# Altium footprint library thu vien thong.PcbLib: 106 footprints (part 7 of 7)
Each footprint in its own frame and in the unit in brackets; x right, y up, seen from the top. Pads: shape width x height; smd on the part's side, far side on the other; paste and mask are expansions set on the pad; w line width, h text height; cw(c..) or ccw(c..) is an arc to the next point about the centre after c.
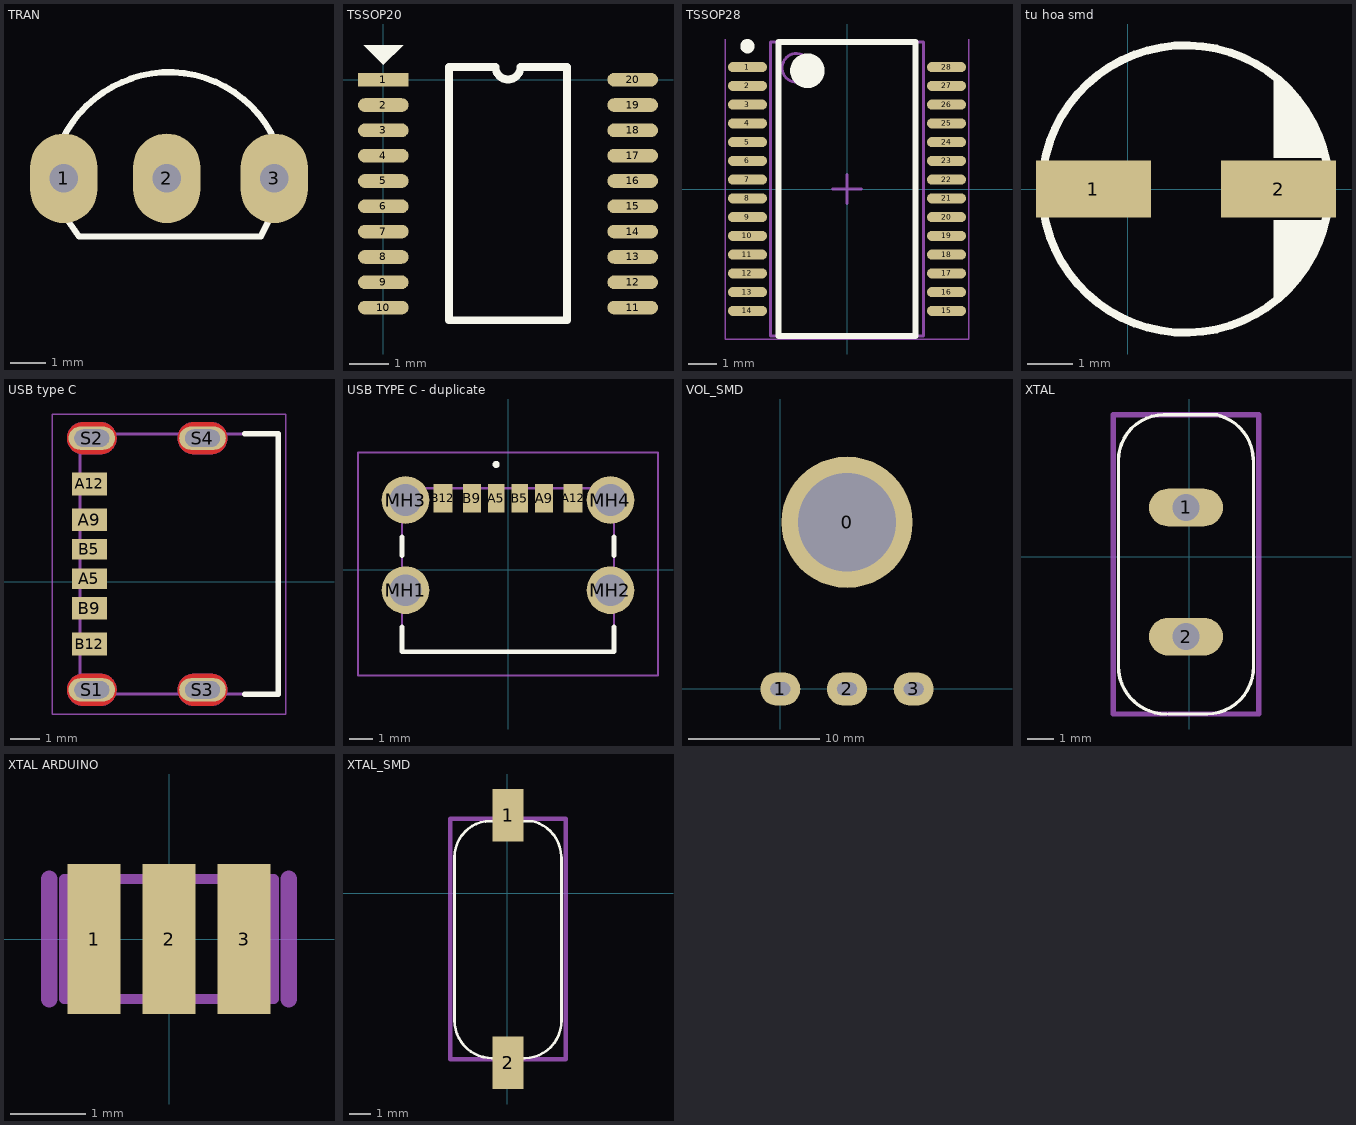
[diagram p6: the footprints below, top view; thin cyan lines are the x and y axes]

## TRAN [mil]
pads (3):
  oval 75x100 hole 32: 1(-1343.62,-418.84) 2(-1228.62,-418.84) 3(-1108.62,-418.84)
Top Overlay:
  lines w7: -1345.15,-375.63 cw(c-1227.65,-431.27) -1267.44,-307.51 ; -1343.96,-459.08 -1326.62,-483.84 -1123.62,-483.84 -1110.62,-457.84 ; -1269.04,-307.63 cw(c-1226.2,-430.37) -1107.14,-378.19
3D body "SW3dPS-TO92.STEP": height 245.04, standoff -199.79, extent -1341.36,-484.41 -1123.62,-323.85

## TSSOP20 [mm]
height 7.62
pads (20):
  rect 1.3x0.35 smd: 1(0,0)
  oval 1.3x0.35 smd: 2(0,-0.65) 3(0,-1.3) 4(0,-1.95) 5(0,-2.6) 6(0,-3.25) 7(0,-3.9) 8(0,-4.55) 9(0,-5.2) 10(0,-5.85) 11(6.4,-5.85) 12(6.4,-5.2) 13(6.4,-4.55) 14(6.4,-3.9) 15(6.4,-3.25) 16(6.4,-2.6) 17(6.4,-1.95) 18(6.4,-1.3) 19(6.4,-0.65) 20(6.4,0)
Top Overlay:
  region: -0.508,0.889 0.508,0.889 0,0.381
  lines w0.2: 2.875,0.325 1.685,0.325 1.685,-6.175 4.715,-6.175 4.715,0.325 3.525,0.325 ; 2.883,0.325 ccw(c3.2,0.325) 3.518,0.325
3D body "User Library-TSSOP-20-1.STEP": height 1, standoff 0, extent 0.02,-6.175 6.43,0.325

## TSSOP28 [mm] "TSSOP, 28-Leads, Body 10.20x5.30mm, Pitch 0.65mm, IPC High Density"
height 1.2
pads (28):
  oval 1.35x0.35 smd: 1(-3.45,4.225) 2(-3.45,3.575) 3(-3.45,2.925) 4(-3.45,2.275) 5(-3.45,1.625) 6(-3.45,0.975) 7(-3.45,0.325) 8(-3.45,-0.325) 9(-3.45,-0.975) 10(-3.45,-1.625) 11(-3.45,-2.275) 12(-3.45,-2.925) 13(-3.45,-3.575) 14(-3.45,-4.225) 15(3.45,-4.225) 16(3.45,-3.575) 17(3.45,-2.925) 18(3.45,-2.275) 19(3.45,-1.625) 20(3.45,-0.975) 21(3.45,-0.325) 22(3.45,0.325) 23(3.45,0.975) 24(3.45,1.625) 25(3.45,2.275) 26(3.45,2.925) 27(3.45,3.575) 28(3.45,4.225)
Top Overlay:
  circle w0.6: c-1.375,4.1 r0.3
  circle w0.25: c-3.45,4.95 r0.125
  lines w0.2: -2.375,-5.1 2.375,-5.1 2.375,5.1 -2.375,5.1 -2.375,-5.1
Mechanical 13:
  circle w0.1: c-1.75,4.2 r0.5
  lines w0.1: -2.65,-5.1 2.65,-5.1 2.65,5.1 -2.65,5.1 -2.65,-5.1
Mechanical 15:
  lines w0.05: -4.225,5.2 -4.225,-5.2 4.225,-5.2 4.225,5.2
  lines w0.1: -0.5,0 0.5,0 ; 0,-0.5 0,0.5
3D body "SOP65P770x200-28N.step": height 2.15, standoff 0, extent -3.878,-5.165 3.878,5.165

## tu hoa smd [mil] "Tu hoa SMD 33 >100 uF,50V, 220uF/16V,25V"
height 100
pads (2):
  rect 100x50 smd: 1(-30,0) 2(131,0)
Top Overlay:
  circle w7: c50,0 r125
  region: 127,98 127,27 172,27 173,9 170,-26 169.75,-27 127,-27 127,-98 141,-86 156,-67 170,-38 175,-19 175,18 170,37 162,58 146,82
  lines w7: -65,0 -45,0 ; -55,-10 -55,-5 -55,5 -55,10

## USB type C [mm]
pads (10):
  rect 1.2x0.7 smd: A5(5.85,0.11) B5(5.85,1.11)
  rect 1.2x0.76 smd: A9(5.85,2.13) B9(5.85,-0.91)
  rect 1.2x0.8 smd: A12(5.85,3.36) B12(5.85,-2.14)
  oval 1.6x0.8 hole 0.6 slot 1.2 at 0 deg mask+0: S1(5.93,-3.71) S2(5.93,4.93) S3(9.73,-3.71) S4(9.73,4.93)
Top Layer:
  region: 8.881,-3.681 8.883,-3.653 8.887,-3.624 8.892,-3.596 8.899,-3.568 8.907,-3.54 8.917,-3.513 8.928,-3.486 8.94,-3.46 8.954,-3.435 8.969,-3.41 8.985,-3.387 9.003,-3.364 9.021,-3.342 9.041,-3.321 9.062,-3.301 9.084,-3.283 9.107,-3.265 9.13,-3.249 9.155,-3.234 9.18,-3.22 9.206,-3.208 9.233,-3.197 9.26,-3.187 9.288,-3.179 9.316,-3.172 9.344,-3.167 9.373,-3.163 9.401,-3.161 9.43,-3.16 10.03,-3.16 10.059,-3.161 10.087,-3.163 10.116,-3.167 10.144,-3.172 10.172,-3.179 10.2,-3.187 10.227,-3.197 10.254,-3.208 10.28,-3.22 10.305,-3.234 10.33,-3.249 10.353,-3.265 10.376,-3.283 10.398,-3.301 10.419,-3.321 10.439,-3.342 10.457,-3.364 10.475,-3.387 10.491,-3.41 10.506,-3.435 10.52,-3.46 10.532,-3.486 10.543,-3.513 10.553,-3.54 10.561,-3.568 10.568,-3.596 10.573,-3.624 10.577,-3.653 10.579,-3.681 10.58,-3.71 10.579,-3.739 10.577,-3.767 10.573,-3.796 10.568,-3.824 10.561,-3.852 10.553,-3.88 10.543,-3.907 10.532,-3.934 10.52,-3.96 10.506,-3.985 10.491,-4.01 10.475,-4.033 10.457,-4.056 10.439,-4.078 10.419,-4.099 10.398,-4.119 10.376,-4.137 10.353,-4.155 10.33,-4.171 10.305,-4.186 10.28,-4.2 10.254,-4.212 10.227,-4.223 10.2,-4.233 10.172,-4.241 10.144,-4.248 10.116,-4.253 10.087,-4.257 10.059,-4.259 10.03,-4.26 9.43,-4.26 9.401,-4.259 9.373,-4.257 9.344,-4.253 9.316,-4.248 9.288,-4.241 9.26,-4.233 9.233,-4.223 9.206,-4.212 9.18,-4.2 9.155,-4.186 9.13,-4.171 9.107,-4.155 9.084,-4.137 9.062,-4.119 9.041,-4.099 9.021,-4.078 9.003,-4.056 8.985,-4.033 8.969,-4.01 8.954,-3.985 8.94,-3.96 8.928,-3.934 8.917,-3.907 8.907,-3.88 8.899,-3.852 8.892,-3.824 8.887,-3.796 8.883,-3.767 8.881,-3.739 8.88,-3.71
  region: 8.881,4.959 8.883,4.987 8.887,5.016 8.892,5.044 8.899,5.072 8.907,5.1 8.917,5.127 8.928,5.154 8.94,5.18 8.954,5.205 8.969,5.23 8.985,5.253 9.003,5.276 9.021,5.298 9.041,5.319 9.062,5.339 9.084,5.357 9.107,5.375 9.13,5.391 9.155,5.406 9.18,5.42 9.206,5.432 9.233,5.443 9.26,5.453 9.288,5.461 9.316,5.468 9.344,5.473 9.373,5.477 9.401,5.479 9.43,5.48 10.03,5.48 10.059,5.479 10.087,5.477 10.116,5.473 10.144,5.468 10.172,5.461 10.2,5.453 10.227,5.443 10.254,5.432 10.28,5.42 10.305,5.406 10.33,5.391 10.353,5.375 10.376,5.357 10.398,5.339 10.419,5.319 10.439,5.298 10.457,5.276 10.475,5.253 10.491,5.23 10.506,5.205 10.52,5.18 10.532,5.154 10.543,5.127 10.553,5.1 10.561,5.072 10.568,5.044 10.573,5.016 10.577,4.987 10.579,4.959 10.58,4.93 10.579,4.901 10.577,4.873 10.573,4.844 10.568,4.816 10.561,4.788 10.553,4.76 10.543,4.733 10.532,4.706 10.52,4.68 10.506,4.655 10.491,4.63 10.475,4.607 10.457,4.584 10.439,4.562 10.419,4.541 10.398,4.521 10.376,4.503 10.353,4.485 10.33,4.469 10.305,4.454 10.28,4.44 10.254,4.428 10.227,4.417 10.2,4.407 10.172,4.399 10.144,4.392 10.116,4.387 10.087,4.383 10.059,4.381 10.03,4.38 9.43,4.38 9.401,4.381 9.373,4.383 9.344,4.387 9.316,4.392 9.288,4.399 9.26,4.407 9.233,4.417 9.206,4.428 9.18,4.44 9.155,4.454 9.13,4.469 9.107,4.485 9.084,4.503 9.062,4.521 9.041,4.541 9.021,4.562 9.003,4.584 8.985,4.607 8.969,4.63 8.954,4.655 8.94,4.68 8.928,4.706 8.917,4.733 8.907,4.76 8.899,4.788 8.892,4.816 8.887,4.844 8.883,4.873 8.881,4.901 8.88,4.93
  region: 5.081,-3.681 5.083,-3.653 5.087,-3.624 5.092,-3.596 5.099,-3.568 5.107,-3.54 5.117,-3.513 5.128,-3.486 5.14,-3.46 5.154,-3.435 5.169,-3.41 5.185,-3.387 5.203,-3.364 5.221,-3.342 5.241,-3.321 5.262,-3.301 5.284,-3.283 5.307,-3.265 5.33,-3.249 5.355,-3.234 5.38,-3.22 5.406,-3.208 5.433,-3.197 5.46,-3.187 5.488,-3.179 5.516,-3.172 5.544,-3.167 5.573,-3.163 5.601,-3.161 5.63,-3.16 6.23,-3.16 6.259,-3.161 6.287,-3.163 6.316,-3.167 6.344,-3.172 6.372,-3.179 6.4,-3.187 6.427,-3.197 6.454,-3.208 6.48,-3.22 6.505,-3.234 6.53,-3.249 6.553,-3.265 6.576,-3.283 6.598,-3.301 6.619,-3.321 6.639,-3.342 6.657,-3.364 6.675,-3.387 6.691,-3.41 6.706,-3.435 6.72,-3.46 6.732,-3.486 6.743,-3.513 6.753,-3.54 6.761,-3.568 6.768,-3.596 6.773,-3.624 6.777,-3.653 6.779,-3.681 6.78,-3.71 6.779,-3.739 6.777,-3.767 6.773,-3.796 6.768,-3.824 6.761,-3.852 6.753,-3.88 6.743,-3.907 6.732,-3.934 6.72,-3.96 6.706,-3.985 6.691,-4.01 6.675,-4.033 6.657,-4.056 6.639,-4.078 6.619,-4.099 6.598,-4.119 6.576,-4.137 6.553,-4.155 6.53,-4.171 6.505,-4.186 6.48,-4.2 6.454,-4.212 6.427,-4.223 6.4,-4.233 6.372,-4.241 6.344,-4.248 6.316,-4.253 6.287,-4.257 6.259,-4.259 6.23,-4.26 5.63,-4.26 5.601,-4.259 5.573,-4.257 5.544,-4.253 5.516,-4.248 5.488,-4.241 5.46,-4.233 5.433,-4.223 5.406,-4.212 5.38,-4.2 5.355,-4.186 5.33,-4.171 5.307,-4.155 5.284,-4.137 5.262,-4.119 5.241,-4.099 5.221,-4.078 5.203,-4.056 5.185,-4.033 5.169,-4.01 5.154,-3.985 5.14,-3.96 5.128,-3.934 5.117,-3.907 5.107,-3.88 5.099,-3.852 5.092,-3.824 5.087,-3.796 5.083,-3.767 5.081,-3.739 5.08,-3.71
  region: 5.081,4.959 5.083,4.987 5.087,5.016 5.092,5.044 5.099,5.072 5.107,5.1 5.117,5.127 5.128,5.154 5.14,5.18 5.154,5.205 5.169,5.23 5.185,5.253 5.203,5.276 5.221,5.298 5.241,5.319 5.262,5.339 5.284,5.357 5.307,5.375 5.33,5.391 5.355,5.406 5.38,5.42 5.406,5.432 5.433,5.443 5.46,5.453 5.488,5.461 5.516,5.468 5.544,5.473 5.573,5.477 5.601,5.479 5.63,5.48 6.23,5.48 6.259,5.479 6.287,5.477 6.316,5.473 6.344,5.468 6.372,5.461 6.4,5.453 6.427,5.443 6.454,5.432 6.48,5.42 6.505,5.406 6.53,5.391 6.553,5.375 6.576,5.357 6.598,5.339 6.619,5.319 6.639,5.298 6.657,5.276 6.675,5.253 6.691,5.23 6.706,5.205 6.72,5.18 6.732,5.154 6.743,5.127 6.753,5.1 6.761,5.072 6.768,5.044 6.773,5.016 6.777,4.987 6.779,4.959 6.78,4.93 6.779,4.901 6.777,4.873 6.773,4.844 6.768,4.816 6.761,4.788 6.753,4.76 6.743,4.733 6.732,4.706 6.72,4.68 6.706,4.655 6.691,4.63 6.675,4.607 6.657,4.584 6.639,4.562 6.619,4.541 6.598,4.521 6.576,4.503 6.553,4.485 6.53,4.469 6.505,4.454 6.48,4.44 6.454,4.428 6.427,4.417 6.4,4.407 6.372,4.399 6.344,4.392 6.316,4.387 6.287,4.383 6.259,4.381 6.23,4.38 5.63,4.38 5.601,4.381 5.573,4.383 5.544,4.387 5.516,4.392 5.488,4.399 5.46,4.407 5.433,4.417 5.406,4.428 5.38,4.44 5.355,4.454 5.33,4.469 5.307,4.485 5.284,4.503 5.262,4.521 5.241,4.541 5.221,4.562 5.203,4.584 5.185,4.607 5.169,4.63 5.154,4.655 5.14,4.68 5.128,4.706 5.117,4.733 5.107,4.76 5.099,4.788 5.092,4.816 5.087,4.844 5.083,4.873 5.081,4.901 5.08,4.93
Bottom Layer:
  region: 8.881,-3.681 8.883,-3.653 8.887,-3.624 8.892,-3.596 8.899,-3.568 8.907,-3.54 8.917,-3.513 8.928,-3.486 8.94,-3.46 8.954,-3.435 8.969,-3.41 8.985,-3.387 9.003,-3.364 9.021,-3.342 9.041,-3.321 9.062,-3.301 9.084,-3.283 9.107,-3.265 9.13,-3.249 9.155,-3.234 9.18,-3.22 9.206,-3.208 9.233,-3.197 9.26,-3.187 9.288,-3.179 9.316,-3.172 9.344,-3.167 9.373,-3.163 9.401,-3.161 9.43,-3.16 10.03,-3.16 10.059,-3.161 10.087,-3.163 10.116,-3.167 10.144,-3.172 10.172,-3.179 10.2,-3.187 10.227,-3.197 10.254,-3.208 10.28,-3.22 10.305,-3.234 10.33,-3.249 10.353,-3.265 10.376,-3.283 10.398,-3.301 10.419,-3.321 10.439,-3.342 10.457,-3.364 10.475,-3.387 10.491,-3.41 10.506,-3.435 10.52,-3.46 10.532,-3.486 10.543,-3.513 10.553,-3.54 10.561,-3.568 10.568,-3.596 10.573,-3.624 10.577,-3.653 10.579,-3.681 10.58,-3.71 10.579,-3.739 10.577,-3.767 10.573,-3.796 10.568,-3.824 10.561,-3.852 10.553,-3.88 10.543,-3.907 10.532,-3.934 10.52,-3.96 10.506,-3.985 10.491,-4.01 10.475,-4.033 10.457,-4.056 10.439,-4.078 10.419,-4.099 10.398,-4.119 10.376,-4.137 10.353,-4.155 10.33,-4.171 10.305,-4.186 10.28,-4.2 10.254,-4.212 10.227,-4.223 10.2,-4.233 10.172,-4.241 10.144,-4.248 10.116,-4.253 10.087,-4.257 10.059,-4.259 10.03,-4.26 9.43,-4.26 9.401,-4.259 9.373,-4.257 9.344,-4.253 9.316,-4.248 9.288,-4.241 9.26,-4.233 9.233,-4.223 9.206,-4.212 9.18,-4.2 9.155,-4.186 9.13,-4.171 9.107,-4.155 9.084,-4.137 9.062,-4.119 9.041,-4.099 9.021,-4.078 9.003,-4.056 8.985,-4.033 8.969,-4.01 8.954,-3.985 8.94,-3.96 8.928,-3.934 8.917,-3.907 8.907,-3.88 8.899,-3.852 8.892,-3.824 8.887,-3.796 8.883,-3.767 8.881,-3.739 8.88,-3.71
  region: 8.881,4.959 8.883,4.987 8.887,5.016 8.892,5.044 8.899,5.072 8.907,5.1 8.917,5.127 8.928,5.154 8.94,5.18 8.954,5.205 8.969,5.23 8.985,5.253 9.003,5.276 9.021,5.298 9.041,5.319 9.062,5.339 9.084,5.357 9.107,5.375 9.13,5.391 9.155,5.406 9.18,5.42 9.206,5.432 9.233,5.443 9.26,5.453 9.288,5.461 9.316,5.468 9.344,5.473 9.373,5.477 9.401,5.479 9.43,5.48 10.03,5.48 10.059,5.479 10.087,5.477 10.116,5.473 10.144,5.468 10.172,5.461 10.2,5.453 10.227,5.443 10.254,5.432 10.28,5.42 10.305,5.406 10.33,5.391 10.353,5.375 10.376,5.357 10.398,5.339 10.419,5.319 10.439,5.298 10.457,5.276 10.475,5.253 10.491,5.23 10.506,5.205 10.52,5.18 10.532,5.154 10.543,5.127 10.553,5.1 10.561,5.072 10.568,5.044 10.573,5.016 10.577,4.987 10.579,4.959 10.58,4.93 10.579,4.901 10.577,4.873 10.573,4.844 10.568,4.816 10.561,4.788 10.553,4.76 10.543,4.733 10.532,4.706 10.52,4.68 10.506,4.655 10.491,4.63 10.475,4.607 10.457,4.584 10.439,4.562 10.419,4.541 10.398,4.521 10.376,4.503 10.353,4.485 10.33,4.469 10.305,4.454 10.28,4.44 10.254,4.428 10.227,4.417 10.2,4.407 10.172,4.399 10.144,4.392 10.116,4.387 10.087,4.383 10.059,4.381 10.03,4.38 9.43,4.38 9.401,4.381 9.373,4.383 9.344,4.387 9.316,4.392 9.288,4.399 9.26,4.407 9.233,4.417 9.206,4.428 9.18,4.44 9.155,4.454 9.13,4.469 9.107,4.485 9.084,4.503 9.062,4.521 9.041,4.541 9.021,4.562 9.003,4.584 8.985,4.607 8.969,4.63 8.954,4.655 8.94,4.68 8.928,4.706 8.917,4.733 8.907,4.76 8.899,4.788 8.892,4.816 8.887,4.844 8.883,4.873 8.881,4.901 8.88,4.93
  region: 5.081,-3.681 5.083,-3.653 5.087,-3.624 5.092,-3.596 5.099,-3.568 5.107,-3.54 5.117,-3.513 5.128,-3.486 5.14,-3.46 5.154,-3.435 5.169,-3.41 5.185,-3.387 5.203,-3.364 5.221,-3.342 5.241,-3.321 5.262,-3.301 5.284,-3.283 5.307,-3.265 5.33,-3.249 5.355,-3.234 5.38,-3.22 5.406,-3.208 5.433,-3.197 5.46,-3.187 5.488,-3.179 5.516,-3.172 5.544,-3.167 5.573,-3.163 5.601,-3.161 5.63,-3.16 6.23,-3.16 6.259,-3.161 6.287,-3.163 6.316,-3.167 6.344,-3.172 6.372,-3.179 6.4,-3.187 6.427,-3.197 6.454,-3.208 6.48,-3.22 6.505,-3.234 6.53,-3.249 6.553,-3.265 6.576,-3.283 6.598,-3.301 6.619,-3.321 6.639,-3.342 6.657,-3.364 6.675,-3.387 6.691,-3.41 6.706,-3.435 6.72,-3.46 6.732,-3.486 6.743,-3.513 6.753,-3.54 6.761,-3.568 6.768,-3.596 6.773,-3.624 6.777,-3.653 6.779,-3.681 6.78,-3.71 6.779,-3.739 6.777,-3.767 6.773,-3.796 6.768,-3.824 6.761,-3.852 6.753,-3.88 6.743,-3.907 6.732,-3.934 6.72,-3.96 6.706,-3.985 6.691,-4.01 6.675,-4.033 6.657,-4.056 6.639,-4.078 6.619,-4.099 6.598,-4.119 6.576,-4.137 6.553,-4.155 6.53,-4.171 6.505,-4.186 6.48,-4.2 6.454,-4.212 6.427,-4.223 6.4,-4.233 6.372,-4.241 6.344,-4.248 6.316,-4.253 6.287,-4.257 6.259,-4.259 6.23,-4.26 5.63,-4.26 5.601,-4.259 5.573,-4.257 5.544,-4.253 5.516,-4.248 5.488,-4.241 5.46,-4.233 5.433,-4.223 5.406,-4.212 5.38,-4.2 5.355,-4.186 5.33,-4.171 5.307,-4.155 5.284,-4.137 5.262,-4.119 5.241,-4.099 5.221,-4.078 5.203,-4.056 5.185,-4.033 5.169,-4.01 5.154,-3.985 5.14,-3.96 5.128,-3.934 5.117,-3.907 5.107,-3.88 5.099,-3.852 5.092,-3.824 5.087,-3.796 5.083,-3.767 5.081,-3.739 5.08,-3.71
  region: 5.081,4.959 5.083,4.987 5.087,5.016 5.092,5.044 5.099,5.072 5.107,5.1 5.117,5.127 5.128,5.154 5.14,5.18 5.154,5.205 5.169,5.23 5.185,5.253 5.203,5.276 5.221,5.298 5.241,5.319 5.262,5.339 5.284,5.357 5.307,5.375 5.33,5.391 5.355,5.406 5.38,5.42 5.406,5.432 5.433,5.443 5.46,5.453 5.488,5.461 5.516,5.468 5.544,5.473 5.573,5.477 5.601,5.479 5.63,5.48 6.23,5.48 6.259,5.479 6.287,5.477 6.316,5.473 6.344,5.468 6.372,5.461 6.4,5.453 6.427,5.443 6.454,5.432 6.48,5.42 6.505,5.406 6.53,5.391 6.553,5.375 6.576,5.357 6.598,5.339 6.619,5.319 6.639,5.298 6.657,5.276 6.675,5.253 6.691,5.23 6.706,5.205 6.72,5.18 6.732,5.154 6.743,5.127 6.753,5.1 6.761,5.072 6.768,5.044 6.773,5.016 6.777,4.987 6.779,4.959 6.78,4.93 6.779,4.901 6.777,4.873 6.773,4.844 6.768,4.816 6.761,4.788 6.753,4.76 6.743,4.733 6.732,4.706 6.72,4.68 6.706,4.655 6.691,4.63 6.675,4.607 6.657,4.584 6.639,4.562 6.619,4.541 6.598,4.521 6.576,4.503 6.553,4.485 6.53,4.469 6.505,4.454 6.48,4.44 6.454,4.428 6.427,4.417 6.4,4.407 6.372,4.399 6.344,4.392 6.316,4.387 6.287,4.383 6.259,4.381 6.23,4.38 5.63,4.38 5.601,4.381 5.573,4.383 5.544,4.387 5.516,4.392 5.488,4.399 5.46,4.407 5.433,4.417 5.406,4.428 5.38,4.44 5.355,4.454 5.33,4.469 5.307,4.485 5.284,4.503 5.262,4.521 5.241,4.541 5.221,4.562 5.203,4.584 5.185,4.607 5.169,4.63 5.154,4.655 5.14,4.68 5.128,4.706 5.117,4.733 5.107,4.76 5.099,4.788 5.092,4.816 5.087,4.844 5.083,4.873 5.081,4.901 5.08,4.93
Top Overlay:
  lines w0.2: 11.18,-3.86 12.33,-3.86 12.33,5.08 11.18,5.08
Top Solder:
  drawing of 4 lines, arcs and shapes, not listed
Bottom Solder:
  drawing of 4 lines, arcs and shapes, not listed
Mechanical 13:
  lines w0.1: 5.53,-3.86 5.53,5.08 12.33,5.08 12.33,-3.86 5.53,-3.86
Mechanical 15:
  lines w0.05: 4.58,-4.54 4.58,5.76 12.58,5.76 12.58,-4.54 4.58,-4.54
3D body "USB4125-GF-A--3DModel-STEP-56544.STEP": height 3.25, standoff -1.26, extent 5.48,-3.86 12.38,5.08

## USB TYPE C - duplicate [mm]
pads (10):
  rect 0.7x1.2 smd: A5(-0.5,3.03) B5(0.5,3.03)
  rect 0.76x1.2 smd: A9(1.52,3.03) B9(-1.52,3.03)
  rect 0.8x1.2 smd: A12(2.75,3.03) B12(-2.75,3.03)
  round 2.01 hole 1.34: MH1(-4.32,-0.85) MH2(4.32,-0.85) MH3(-4.32,2.95) MH4(4.32,2.95)
Top Overlay:
  lines w0.2: -4.47,-2.4 -4.47,-3.45 4.47,-3.45 4.47,-2.4 ; -4.47,0.6 -4.47,1.4 ; 4.47,0.6 4.47,1.4 ; -0.5,4.4 cw(c-0.5,4.45) -0.5,4.5 ; -0.5,4.4 ccw(c-0.5,4.45) -0.5,4.5 ; -0.5,4.4 cw(c-0.5,4.45) -0.5,4.5
Mechanical 13:
  lines w0.1: -4.47,-3.45 -4.47,3.45 4.47,3.45 4.47,-3.45 -4.47,-3.45
Mechanical 15:
  lines w0.1: -6.325,-4.45 -6.325,4.955 6.325,4.955 6.325,-4.45 -6.325,-4.45
3D body "217175-0001.stp": height 3.23, standoff -1.93, extent -4.47,-3.36 4.47,3.54

## VOL_SMD [mil]
pads (4):
  round 393.7 hole 295.28: 0(200,500)
  oval 120x100 hole 40 slot 60 at 0 deg: 1(0,0) 2(200,0) 3(400,0)
Bottom Overlay:
  circle w12: c200,500 r215.01
  circle w12: c0,150 r50
  circle w12: c200,150 r50
  circle w12: c400,150 r50
  lines w12: -57.25,301.71 cw(c200,500) 455.57,299.55 ; -55,299 127,299 ; -49,700 119,700 ; 281,298 455,298 ; 286,698 454,698 ; 455,295 500,250 500,-75 -100,-75 -100,255 ; -100,255 -55,300 -100,255
3D body "SW3dPS-omeg pot.STEP": height 866.14, standoff -407.48, extent -203.15,-247.08 600,947.08

## XTAL [mil]
pads (2):
  rrect100% 110x56 hole 40: 1(-5,73) 2(-5,-119)
Top Overlay:
  lines w5: -105.39,142.88 cw(c-37.97,143.37) -38.46,210.8 41.26,210.8 ; -105.39,143.21 -105.39,-163.22 ccw(c-34.53,-163.22) -34.53,-234.09 ; -30.59,-234.09 26.5,-234.09 ccw(c25.51,-164.2) 95.39,-163.22 95.39,143.36 ; 45.38,209.26 cw(c26.28,143.36) 94.87,144.55
Mechanical 13:
  lines w7.87: -113.27,-234.09 103.27,-234.09 103.27,210.8 -113.27,210.8 -113.27,-234.09
3D body: height 140, standoff 7.87, extent -76.85,-207.51 67.83,183.48
3D body: height 31.5, standoff 5, extent -94.85,-224.5 85.15,200.5
3D body: height 200, standoff 0, extent -15,-129.2 5,-109.2
3D body: height 200, standoff 0, extent -15,62.8 5,82.8

## XTAL ARDUINO [mm] "RESONATOR"
pads (3):
  rect 0.7x2 smd: 1(-1,0) 2(0,0) 3(1,0)
Mechanical 2:
  lines w0.22: -1.6,-0.8 -1.6,0.8 ; 1.6,-0.8 1.6,0.8
Mechanical 18:
  lines w0.127: -1.4,-0.8 1.4,-0.8 1.4,0.8 -1.4,0.8 -1.4,-0.8

## XTAL_SMD [mm]
pads (2):
  rect 1.5x2.5 smd: 1(0.034,3.712) 2(0.034,-8.088)
Top Overlay:
  lines w0.127: -2.516,1.708 cw(c-0.804,1.72) -0.816,3.433 1.209,3.433 ; -2.516,1.716 -2.516,-6.067 ccw(c-0.716,-6.067) -0.716,-7.867 ; -0.728,-7.867 0.834,-7.867 ccw(c0.809,-6.092) 2.584,-6.067 2.584,1.72 ; 1.314,3.393 cw(c0.829,1.72) 2.571,1.75
Mechanical 13:
  lines w0.2: -2.716,-7.916 2.784,-7.916 2.784,3.539 -2.716,3.539 -2.716,-7.916